# Altium integrated library SJ Sockets & Connectors.IntLib: 179 symbols (part 1 of 2) (continued)
## FHDR_1X17
designator P?
Female Header 1X17
footprint FHDR1X17-254P (Female Header 1X17 with 2.54 mm Pitch)
pins: 1, 2, 3, 4, 5, 6, 7, 8, 9, 10, 11, 12, 13, 14, 15, 16, 17
1 alternate drawing of the same symbol

## FHDR_1X18
designator P?
Female Header 1X18
footprint FHDR1X18-254P (Female Header 1X18 with 2.54 mm Pitch)
pins: 1, 2, 3, 4, 5, 6, 7, 8, 9, 10, 11, 12, 13, 14, 15, 16, 17, 18
1 alternate drawing of the same symbol

## FHDR_1X19
designator P?
Female Header 1X19
footprint FHDR1X19-254P (Female Header 1X19 with 2.54 mm Pitch)
pins: 1, 2, 3, 4, 5, 6, 7, 8, 9, 10, 11, 12, 13, 14, 15, 16, 17, 18, 19
1 alternate drawing of the same symbol

## FHDR_1X20
designator P?
Female Header 1X20
footprint FHDR1X20-254P (Female Header 1X20 with 2.54 mm Pitch)
pins: 1, 2, 3, 4, 5, 6, 7, 8, 9, 10, 11, 12, 13, 14, 15, 16, 17, 18, 19, 20
1 alternate drawing of the same symbol

## FHDR_1X22
designator P?
Female Header 1X22
footprint FHDR1X22-254P (Female Header 1X22 with 2.54 mm Pitch)
pins: 1, 2, 3, 4, 5, 6, 7, 8, 9, 10, 11, 12, 13, 14, 15, 16, 17, 18, 19, 20, 21, 22
1 alternate drawing of the same symbol

## FHDR_1X24
designator P?
Female Header 1X24
footprint FHDR1X24-254P (Female Header 1X24 with 2.54 mm Pitch)
pins: 1, 2, 3, 4, 5, 6, 7, 8, 9, 10, 11, 12, 13, 14, 15, 16, 17, 18, 19, 20, 21, 22, 23, 24
1 alternate drawing of the same symbol

## FHDR_1X25
designator P?
Female Header 1X25
footprint FHDR1X25-254P (Female Header 1X25 with 2.54 mm Pitch)
pins: 1, 2, 3, 4, 5, 6, 7, 8, 9, 10, 11, 12, 13, 14, 15, 16, 17, 18, 19, 20, 21, 22, 23, 24, 25
1 alternate drawing of the same symbol

## FHDR_1X26
designator P?
Female Header 1X26
footprint FHDR1X26-254P (Female Header 1X26 with 2.54 mm Pitch)
pins: 1, 2, 3, 4, 5, 6, 7, 8, 9, 10, 11, 12, 13, 14, 15, 16, 17, 18, 19, 20, 21, 22, 23, 24, 25, 26
1 alternate drawing of the same symbol

## FHDR_1X28
designator P?
Female Header 1X28
footprint FHDR1X28-254P (Female Header 1X28 with 2.54 mm Pitch)
pins: 1, 2, 3, 4, 5, 6, 7, 8, 9, 10, 11, 12, 13, 14, 15, 16, 17, 18, 19, 20, 21, 22, 23, 24, 25, 26, 27, 28
1 alternate drawing of the same symbol

## FHDR_1X30
designator P?
Female Header 1X30
footprint FHDR1X30-254P (Female Header 1X30 with 2.54 mm Pitch)
pins: 1, 2, 3, 4, 5, 6, 7, 8, 9, 10, 11, 12, 13, 14, 15, 16, 17, 18, 19, 20, 21, 22, 23, 24, 25, 26, 27, 28, 29, 30
1 alternate drawing of the same symbol

## FHDR_1X32
designator P?
Female Header 1X32
footprint FHDR1X32-254P (Female Header 1X32 with 2.54 mm Pitch)
pins: 1, 2, 3, 4, 5, 6, 7, 8, 9, 10, 11, 12, 13, 14, 15, 16, 17, 18, 19, 20, 21, 22, 23, 24, 25, 26, 27, 28, 29, 30, 31, 32
1 alternate drawing of the same symbol

## FHDR_1X34
designator P?
Female Header 1X34
footprint FHDR1X34-254P (Female Header 1X34 with 2.54 mm Pitch)
pins: 1, 2, 3, 4, 5, 6, 7, 8, 9, 10, 11, 12, 13, 14, 15, 16, 17, 18, 19, 20, 21, 22, 23, 24, 25, 26, 27, 28, 29, 30, 31, 32, 33, 34
1 alternate drawing of the same symbol

## FHDR_1X35
designator P?
Female Header 1X35
footprint FHDR1X35-254P (Female Header 1X35 with 2.54 mm Pitch)
pins: 1, 2, 3, 4, 5, 6, 7, 8, 9, 10, 11, 12, 13, 14, 15, 16, 17, 18, 19, 20, 21, 22, 23, 24, 25, 26, 27, 28, 29, 30, 31, 32, 33, 34, 35
1 alternate drawing of the same symbol

## FHDR_1X36
designator P?
Female Header 1X36
footprint FHDR1X36-254P (Female Header 1X36 with 2.54 mm Pitch)
pins: 1, 2, 3, 4, 5, 6, 7, 8, 9, 10, 11, 12, 13, 14, 15, 16, 17, 18, 19, 20, 21, 22, 23, 24, 25, 26, 27, 28, 29, 30, 31, 32, 33, 34, 35, 36
1 alternate drawing of the same symbol

## FHDR_1X38
designator P?
Female Header 1X38
footprint FHDR1X38-254P (Female Header 1X38 with 2.54 mm Pitch)
pins: 1, 2, 3, 4, 5, 6, 7, 8, 9, 10, 11, 12, 13, 14, 15, 16, 17, 18, 19, 20, 21, 22, 23, 24, 25, 26, 27, 28, 29, 30, 31, 32, 33, 34, 35, 36, 37, 38
1 alternate drawing of the same symbol

## FHDR_1X40
designator P?
Female Header 1X40
footprint FHDR1X40-254P (Female Header 1X40 with 2.54 mm Pitch)
pins: 1, 2, 3, 4, 5, 6, 7, 8, 9, 10, 11, 12, 13, 14, 15, 16, 17, 18, 19, 20, 21, 22, 23, 24, 25, 26, 27, 28, 29, 30, 31, 32, 33, 34, 35, 36, 37, 38, 39, 40
1 alternate drawing of the same symbol

## FHDR_2X02
designator P?
Female Header 2X02
footprint FHDR2X02-254P (Female Header 2X02 with 2.54 mm Pitch)
pins: 1, 2, 3, 4
1 alternate drawing of the same symbol

## FHDR_2X03
designator P?
Female Header 2X03
footprint FHDR2X03-254P (Female Header 2X03 with 2.54 mm Pitch)
pins: 1, 2, 3, 4, 5, 6
1 alternate drawing of the same symbol

## FHDR_2X04
designator P?
Female Header 2X04
footprint FHDR2X04-254P (Female Header 2X04 with 2.54 mm Pitch)
pins: 1, 2, 3, 4, 5, 6, 7, 8
1 alternate drawing of the same symbol

## FHDR_2X05
designator P?
Female Header 2X05
footprint FHDR2X05-254P (Female Header 2X05 with 2.54 mm Pitch)
pins: 1, 2, 3, 4, 5, 6, 7, 8, 9, 10
1 alternate drawing of the same symbol

## FHDR_2X06
designator P?
Female Header 2X06
footprint FHDR2X06-254P (Female Header 2X06 with 2.54 mm Pitch)
pins: 1, 2, 3, 4, 5, 6, 7, 8, 9, 10, 11, 12
1 alternate drawing of the same symbol

## FHDR_2X07
designator P?
Female Header 2X07
footprint FHDR2X07-254P (Female Header 2X07 with 2.54 mm Pitch)
pins: 1, 2, 3, 4, 5, 6, 7, 8, 9, 10, 11, 12, 13, 14
1 alternate drawing of the same symbol

## FHDR_2X08
designator P?
Female Header 2X08
footprint FHDR2X08-254P (Female Header 2X08 with 2.54 mm Pitch)
pins: 1, 2, 3, 4, 5, 6, 7, 8, 9, 10, 11, 12, 13, 14, 15, 16
1 alternate drawing of the same symbol

## FHDR_2X09
designator P?
Female Header 2X09
footprint FHDR2X09-254P (Female Header 2X09 with 2.54 mm Pitch)
pins: 1, 2, 3, 4, 5, 6, 7, 8, 9, 10, 11, 12, 13, 14, 15, 16, 17, 18
1 alternate drawing of the same symbol

## FHDR_2X10
designator P?
Female Header 2X10
footprint FHDR2X10-254P (Female Header 2X10 with 2.54 mm Pitch)
pins: 1, 2, 3, 4, 5, 6, 7, 8, 9, 10, 11, 12, 13, 14, 15, 16, 17, 18, 19, 20
1 alternate drawing of the same symbol

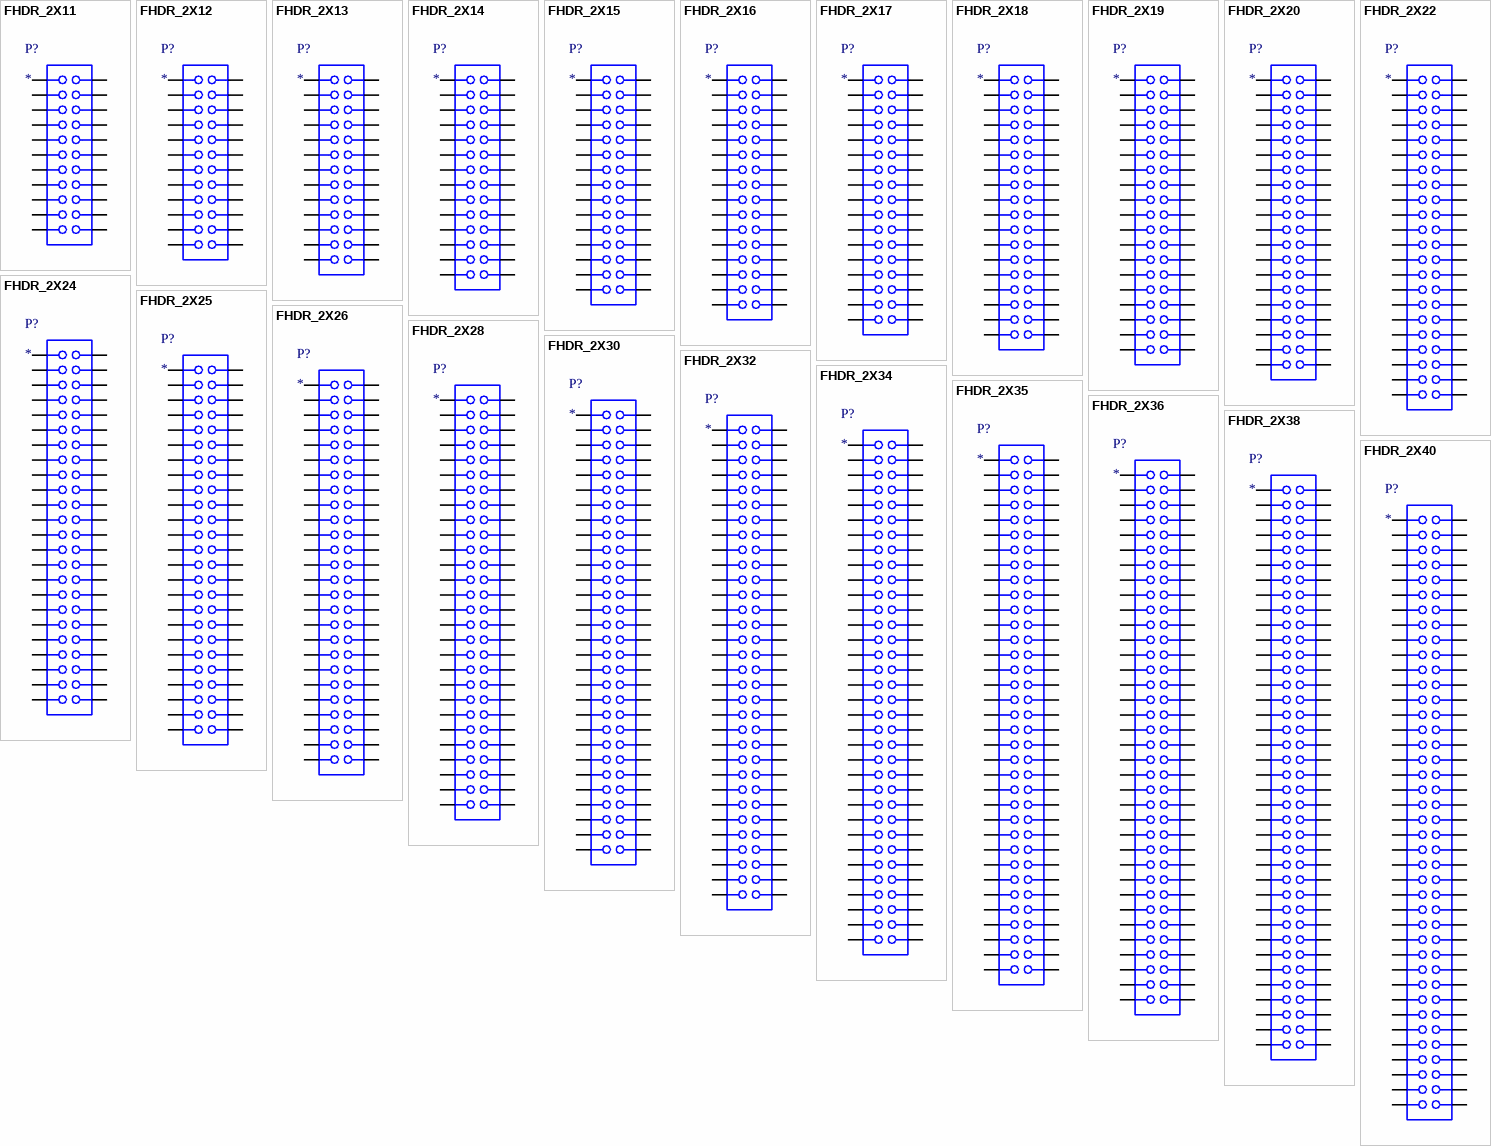
[diagram p3: symbols FHDR_2X11 to FHDR_2X40]

## FHDR_2X11
designator P?
Female Header 2X11
footprint FHDR2X11-254P (Female Header 2X11 with 2.54 mm Pitch)
pins: 1, 2, 3, 4, 5, 6, 7, 8, 9, 10, 11, 12, 13, 14, 15, 16, 17, 18, 19, 20, 21, 22
1 alternate drawing of the same symbol

## FHDR_2X12
designator P?
Female Header 2X12
footprint FHDR2X12-254P (Female Header 2X12 with 2.54 mm Pitch)
pins: 1, 2, 3, 4, 5, 6, 7, 8, 9, 10, 11, 12, 13, 14, 15, 16, 17, 18, 19, 20, 21, 22, 23, 24
1 alternate drawing of the same symbol

## FHDR_2X13
designator P?
Female Header 2X13
footprint FHDR2X13-254P (Female Header 2X13 with 2.54 mm Pitch)
pins: 1, 2, 3, 4, 5, 6, 7, 8, 9, 10, 11, 12, 13, 14, 15, 16, 17, 18, 19, 20, 21, 22, 23, 24, 25, 26
1 alternate drawing of the same symbol

## FHDR_2X14
designator P?
Female Header 2X14
footprint FHDR2X14-254P (Female Header 2X14 with 2.54 mm Pitch)
pins: 1, 2, 3, 4, 5, 6, 7, 8, 9, 10, 11, 12, 13, 14, 15, 16, 17, 18, 19, 20, 21, 22, 23, 24, 25, 26, 27, 28
1 alternate drawing of the same symbol

## FHDR_2X15
designator P?
Female Header 2X15
footprint FHDR2X15-254P (Female Header 2X15 with 2.54 mm Pitch)
pins: 1, 2, 3, 4, 5, 6, 7, 8, 9, 10, 11, 12, 13, 14, 15, 16, 17, 18, 19, 20, 21, 22, 23, 24, 25, 26, 27, 28, 29, 30
1 alternate drawing of the same symbol

## FHDR_2X16
designator P?
Female Header 2X16
footprint FHDR2X16-254P (Female Header 2X16 with 2.54 mm Pitch)
pins: 1, 2, 3, 4, 5, 6, 7, 8, 9, 10, 11, 12, 13, 14, 15, 16, 17, 18, 19, 20, 21, 22, 23, 24, 25, 26, 27, 28, 29, 30, 31, 32
1 alternate drawing of the same symbol

## FHDR_2X17
designator P?
Female Header 2X17
footprint FHDR2X17-254P (Female Header 2X17 with 2.54 mm Pitch)
pins: 1, 2, 3, 4, 5, 6, 7, 8, 9, 10, 11, 12, 13, 14, 15, 16, 17, 18, 19, 20, 21, 22, 23, 24, 25, 26, 27, 28, 29, 30, 31, 32, 33, 34
1 alternate drawing of the same symbol

## FHDR_2X18
designator P?
Female Header 2X18
footprint FHDR2X18-254P (Female Header 2X18 with 2.54 mm Pitch)
pins: 1, 2, 3, 4, 5, 6, 7, 8, 9, 10, 11, 12, 13, 14, 15, 16, 17, 18, 19, 20, 21, 22, 23, 24, 25, 26, 27, 28, 29, 30, 31, 32, 33, 34, 35, 36
1 alternate drawing of the same symbol

## FHDR_2X19
designator P?
Female Header 2X19
footprint FHDR2X19-254P (Female Header 2X19 with 2.54 mm Pitch)
pins: 1, 2, 3, 4, 5, 6, 7, 8, 9, 10, 11, 12, 13, 14, 15, 16, 17, 18, 19, 20, 21, 22, 23, 24, 25, 26, 27, 28, 29, 30, 31, 32, 33, 34, 35, 36, 37, 38
1 alternate drawing of the same symbol

## FHDR_2X20
designator P?
Female Header 2X20
footprint FHDR2X20-254P (Female Header 2X20 with 2.54 mm Pitch)
pins: 1, 2, 3, 4, 5, 6, 7, 8, 9, 10, 11, 12, 13, 14, 15, 16, 17, 18, 19, 20, 21, 22, 23, 24, 25, 26, 27, 28, 29, 30, 31, 32, 33, 34, 35, 36, 37, 38, 39, 40
1 alternate drawing of the same symbol

## FHDR_2X22
designator P?
Female Header 2X22
footprint FHDR2X22-254P (Female Header 2X22 with 2.54 mm Pitch)
pins: 1, 2, 3, 4, 5, 6, 7, 8, 9, 10, 11, 12, 13, 14, 15, 16, 17, 18, 19, 20, 21, 22, 23, 24, 25, 26, 27, 28, 29, 30, 31, 32, 33, 34, 35, 36, 37, 38, 39, 40, 41, 42, 43, 44
1 alternate drawing of the same symbol

## FHDR_2X24
designator P?
Female Header 2X24
footprint FHDR2X24-254P (Female Header 2X24 with 2.54 mm Pitch)
pins: 1, 2, 3, 4, 5, 6, 7, 8, 9, 10, 11, 12, 13, 14, 15, 16, 17, 18, 19, 20, 21, 22, 23, 24, 25, 26, 27, 28, 29, 30, 31, 32, 33, 34, 35, 36, 37, 38, 39, 40, 41, 42, 43, 44, 45, 46, 47, 48
1 alternate drawing of the same symbol

## FHDR_2X25
designator P?
Female Header 2X25
footprint FHDR2X25-254P (Female Header 2X25 with 2.54 mm Pitch)
pins: 1, 2, 3, 4, 5, 6, 7, 8, 9, 10, 11, 12, 13, 14, 15, 16, 17, 18, 19, 20, 21, 22, 23, 24, 25, 26, 27, 28, 29, 30, 31, 32, 33, 34, 35, 36, 37, 38, 39, 40, 41, 42, 43, 44, 45, 46, 47, 48, 49, 50
1 alternate drawing of the same symbol

## FHDR_2X26
designator P?
Female Header 2X26
footprint FHDR2X26-254P (Female Header 2X26 with 2.54 mm Pitch)
pins: 1, 2, 3, 4, 5, 6, 7, 8, 9, 10, 11, 12, 13, 14, 15, 16, 17, 18, 19, 20, 21, 22, 23, 24, 25, 26, 27, 28, 29, 30, 31, 32, 33, 34, 35, 36, 37, 38, 39, 40, 41, 42, 43, 44, 45, 46, 47, 48, 49, 50, 51, 52
1 alternate drawing of the same symbol

## FHDR_2X28
designator P?
Female Header 2X28
footprint FHDR2X28-254P (Female Header 2X28 with 2.54 mm Pitch)
pins: 1, 2, 3, 4, 5, 6, 7, 8, 9, 10, 11, 12, 13, 14, 15, 16, 17, 18, 19, 20, 21, 22, 23, 24, 25, 26, 27, 28, 29, 30, 31, 32, 33, 34, 35, 36, 37, 38, 39, 40, 41, 42, 43, 44, 45, 46, 47, 48, 49, 50, 51, 52, 53, 54, 55, 56
1 alternate drawing of the same symbol

## FHDR_2X30
designator P?
Female Header 2X30
footprint FHDR2X30-254P (Female Header 2X30 with 2.54 mm Pitch)
pins: 1, 2, 3, 4, 5, 6, 7, 8, 9, 10, 11, 12, 13, 14, 15, 16, 17, 18, 19, 20, 21, 22, 23, 24, 25, 26, 27, 28, 29, 30, 31, 32, 33, 34, 35, 36, 37, 38, 39, 40, 41, 42, 43, 44, 45, 46, 47, 48, 49, 50, 51, 52, 53, 54, 55, 56, 57, 58, 59, 60
1 alternate drawing of the same symbol

## FHDR_2X32
designator P?
Female Header 2X32
footprint FHDR2X32-254P (Female Header 2X32 with 2.54 mm Pitch)
pins: 1, 2, 3, 4, 5, 6, 7, 8, 9, 10, 11, 12, 13, 14, 15, 16, 17, 18, 19, 20, 21, 22, 23, 24, 25, 26, 27, 28, 29, 30, 31, 32, 33, 34, 35, 36, 37, 38, 39, 40, 41, 42, 43, 44, 45, 46, 47, 48, 49, 50, 51, 52, 53, 54, 55, 56, 57, 58, 59, 60, 61, 62, 63, 64
1 alternate drawing of the same symbol

## FHDR_2X34
designator P?
Female Header 2X34
footprint FHDR2X34-254P (Female Header 2X34 with 2.54 mm Pitch)
pins: 1, 2, 3, 4, 5, 6, 7, 8, 9, 10, 11, 12, 13, 14, 15, 16, 17, 18, 19, 20, 21, 22, 23, 24, 25, 26, 27, 28, 29, 30, 31, 32, 33, 34, 35, 36, 37, 38, 39, 40, 41, 42, 43, 44, 45, 46, 47, 48, 49, 50, 51, 52, 53, 54, 55, 56, 57, 58, 59, 60, 61, 62, 63, 64, 65, 66, 67, 68
1 alternate drawing of the same symbol

## FHDR_2X35
designator P?
Female Header 2X35
footprint FHDR2X35-254P (Female Header 2X35 with 2.54 mm Pitch)
pins: 1, 2, 3, 4, 5, 6, 7, 8, 9, 10, 11, 12, 13, 14, 15, 16, 17, 18, 19, 20, 21, 22, 23, 24, 25, 26, 27, 28, 29, 30, 31, 32, 33, 34, 35, 36, 37, 38, 39, 40, 41, 42, 43, 44, 45, 46, 47, 48, 49, 50, 51, 52, 53, 54, 55, 56, 57, 58, 59, 60, 61, 62, 63, 64, 65, 66, 67, 68, 69, 70
1 alternate drawing of the same symbol

## FHDR_2X36
designator P?
Female Header 2X36
footprint FHDR2X36-254P (Female Header 2X36 with 2.54 mm Pitch)
pins: 1, 2, 3, 4, 5, 6, 7, 8, 9, 10, 11, 12, 13, 14, 15, 16, 17, 18, 19, 20, 21, 22, 23, 24, 25, 26, 27, 28, 29, 30, 31, 32, 33, 34, 35, 36, 37, 38, 39, 40, 41, 42, 43, 44, 45, 46, 47, 48, 49, 50, 51, 52, 53, 54, 55, 56, 57, 58, 59, 60, 61, 62, 63, 64, 65, 66, 67, 68, 69, 70, 71, 72
1 alternate drawing of the same symbol

## FHDR_2X38
designator P?
Female Header 2X38
footprint FHDR2X38-254P (Female Header 2X38 with 2.54 mm Pitch)
pins: 1, 2, 3, 4, 5, 6, 7, 8, 9, 10, 11, 12, 13, 14, 15, 16, 17, 18, 19, 20, 21, 22, 23, 24, 25, 26, 27, 28, 29, 30, 31, 32, 33, 34, 35, 36, 37, 38, 39, 40, 41, 42, 43, 44, 45, 46, 47, 48, 49, 50, 51, 52, 53, 54, 55, 56, 57, 58, 59, 60, 61, 62, 63, 64, 65, 66, 67, 68, 69, 70, 71, 72, 73, 74, 75, 76
1 alternate drawing of the same symbol

## FHDR_2X40
designator P?
Female Header 2X40
footprint FHDR2X40-254P (Female Header 2X40 with 2.54 mm Pitch)
pins: 1, 2, 3, 4, 5, 6, 7, 8, 9, 10, 11, 12, 13, 14, 15, 16, 17, 18, 19, 20, 21, 22, 23, 24, 25, 26, 27, 28, 29, 30, 31, 32, 33, 34, 35, 36, 37, 38, 39, 40, 41, 42, 43, 44, 45, 46, 47, 48, 49, 50, 51, 52, 53, 54, 55, 56, 57, 58, 59, 60, 61, 62, 63, 64, 65, 66, 67, 68, 69, 70, 71, 72, 73, 74, 75, 76, 77, 78, 79, 80
1 alternate drawing of the same symbol


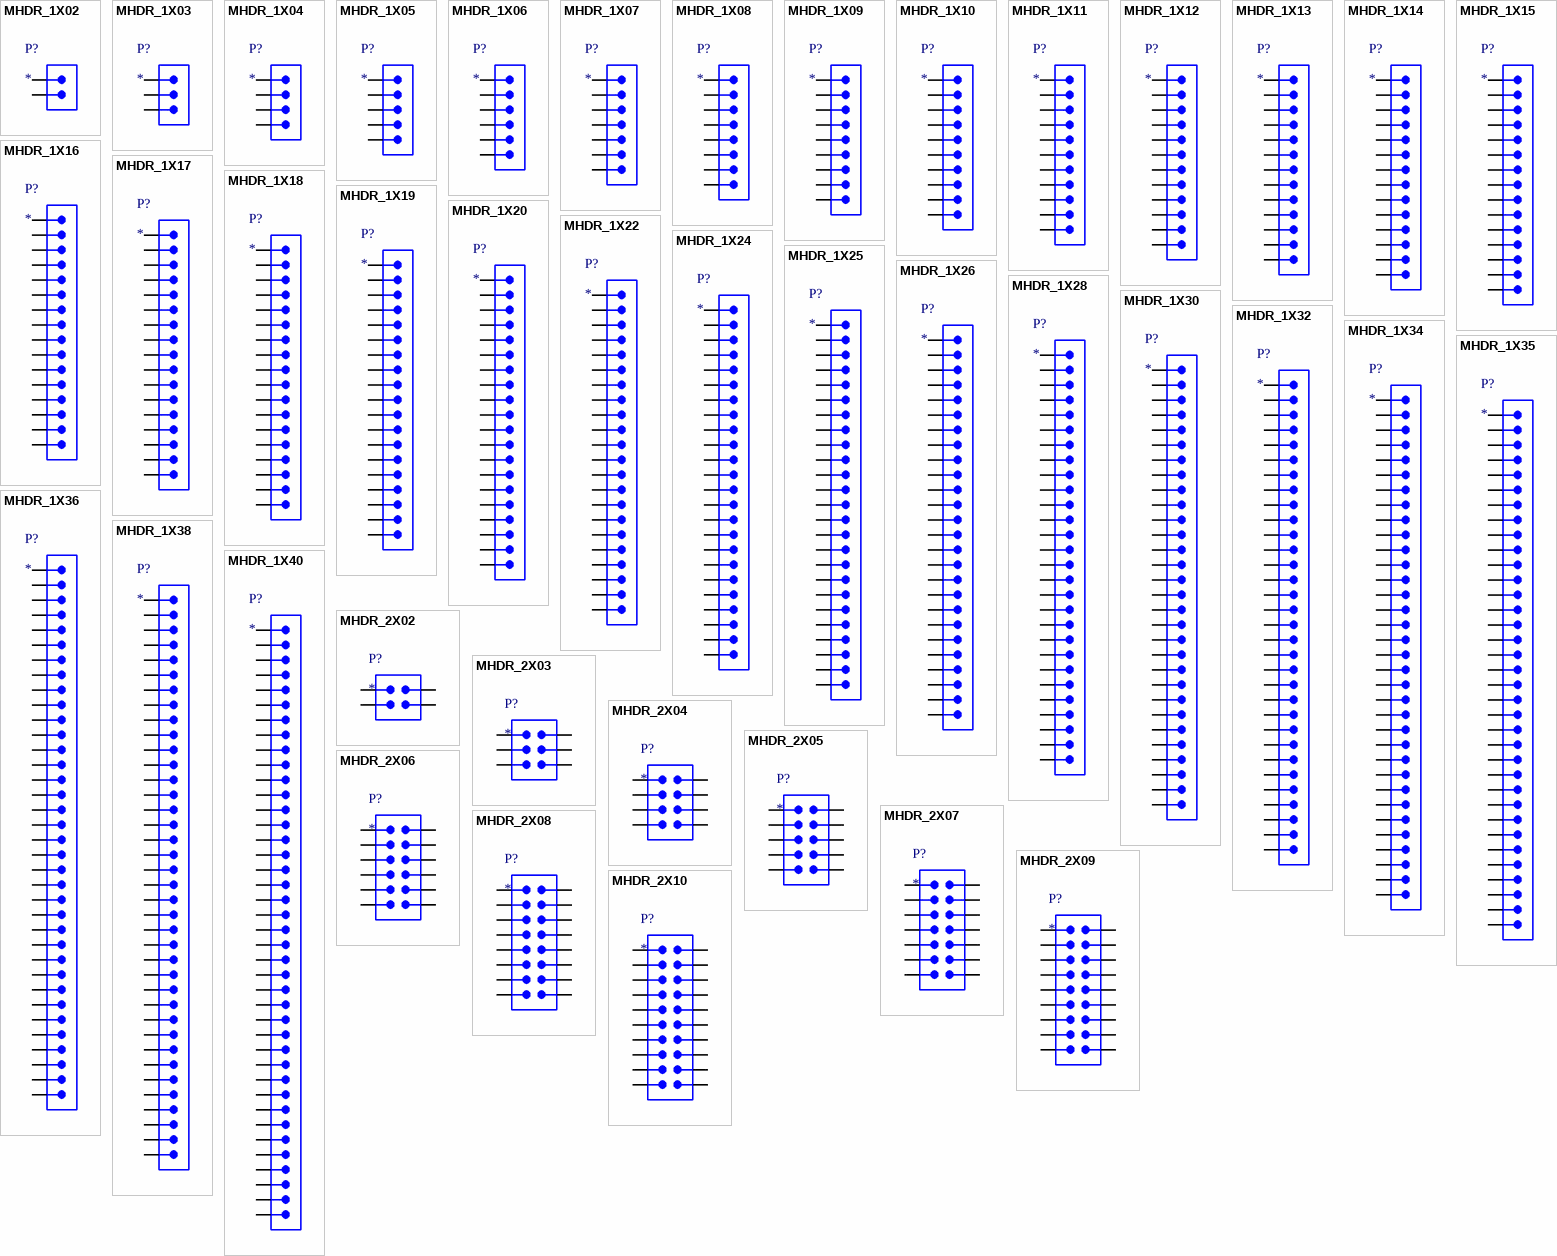
[diagram p4: symbols MHDR_1X02 to MHDR_2X10]

## MHDR_1X02
designator P?
Male Header 1X02
footprint MHDR1X02-254P (Male Header 1X02 with 2.54 mm Pitch)
pins: 1, 2
1 alternate drawing of the same symbol

## MHDR_1X03
designator P?
Male Header 1X03
footprint MHDR1X03-254P (Male Header 1X03 with 2.54 mm Pitch)
pins: 1, 2, 3
1 alternate drawing of the same symbol

## MHDR_1X04
designator P?
Male Header 1X04
footprint MHDR1X04-254P (Male Header 1X04 with 2.54 mm Pitch)
pins: 1, 2, 3, 4
1 alternate drawing of the same symbol

## MHDR_1X05
designator P?
Male Header 1X05
footprint MHDR1X05-254P (Male Header 1X05 with 2.54 mm Pitch)
pins: 1, 2, 3, 4, 5
1 alternate drawing of the same symbol

## MHDR_1X06
designator P?
Male Header 1X06
footprint MHDR1X06-254P (Male Header 1X06 with 2.54 mm Pitch)
pins: 1, 2, 3, 4, 5, 6
1 alternate drawing of the same symbol

## MHDR_1X07
designator P?
Male Header 1X07
footprint MHDR1X07-254P (Male Header 1X07 with 2.54 mm Pitch)
pins: 1, 2, 3, 4, 5, 6, 7
1 alternate drawing of the same symbol

## MHDR_1X08
designator P?
Male Header 1X08
footprint MHDR1X08-254P (Male Header 1X08 with 2.54 mm Pitch)
pins: 1, 2, 3, 4, 5, 6, 7, 8
1 alternate drawing of the same symbol

## MHDR_1X09
designator P?
Male Header 1X09
footprint MHDR1X09-254P (Male Header 1X09 with 2.54 mm Pitch)
pins: 1, 2, 3, 4, 5, 6, 7, 8, 9
1 alternate drawing of the same symbol

## MHDR_1X10
designator P?
Male Header 1X10
footprint MHDR1X10-254P - E (Male Header 1X10 with 2.54 mm Pitch)
footprint MHDR1X10-254P (Male Header 1X10 with 2.54 mm Pitch)
pins: 1, 2, 3, 4, 5, 6, 7, 8, 9, 10
1 alternate drawing of the same symbol

## MHDR_1X11
designator P?
Male Header 1X11
footprint MHDR1X11-254P (Male Header 1X11 with 2.54 mm Pitch)
pins: 1, 2, 3, 4, 5, 6, 7, 8, 9, 10, 11
1 alternate drawing of the same symbol

## MHDR_1X12
designator P?
Male Header 1X12
footprint MHDR1X12-254P (Male Header 1X12 with 2.54 mm Pitch)
pins: 1, 2, 3, 4, 5, 6, 7, 8, 9, 10, 11, 12
1 alternate drawing of the same symbol

## MHDR_1X13
designator P?
Male Header 1X13
footprint MHDR1X13-254P (Male Header 1X13 with 2.54 mm Pitch)
pins: 1, 2, 3, 4, 5, 6, 7, 8, 9, 10, 11, 12, 13
1 alternate drawing of the same symbol

## MHDR_1X14
designator P?
Male Header 1X14
footprint MHDR1X14-254P (Male Header 1X14 with 2.54 mm Pitch)
pins: 1, 2, 3, 4, 5, 6, 7, 8, 9, 10, 11, 12, 13, 14
1 alternate drawing of the same symbol

## MHDR_1X15
designator P?
Male Header 1X15
footprint MHDR1X15-254P (Male Header 1X15 with 2.54 mm Pitch)
pins: 1, 2, 3, 4, 5, 6, 7, 8, 9, 10, 11, 12, 13, 14, 15
1 alternate drawing of the same symbol

## MHDR_1X16
designator P?
Male Header 1X16
footprint MHDR1X16-254P (Male Header 1X16 with 2.54 mm Pitch)
pins: 1, 2, 3, 4, 5, 6, 7, 8, 9, 10, 11, 12, 13, 14, 15, 16
1 alternate drawing of the same symbol

## MHDR_1X17
designator P?
Male Header 1X17
footprint MHDR1X17-254P (Male Header 1X17 with 2.54 mm Pitch)
pins: 1, 2, 3, 4, 5, 6, 7, 8, 9, 10, 11, 12, 13, 14, 15, 16, 17
1 alternate drawing of the same symbol

## MHDR_1X18
designator P?
Male Header 1X18
footprint MHDR1X18-254P (Male Header 1X18 with 2.54 mm Pitch)
pins: 1, 2, 3, 4, 5, 6, 7, 8, 9, 10, 11, 12, 13, 14, 15, 16, 17, 18
1 alternate drawing of the same symbol

## MHDR_1X19
designator P?
Male Header 1X19
footprint MHDR1X19-254P (Male Header 1X19 with 2.54 mm Pitch)
pins: 1, 2, 3, 4, 5, 6, 7, 8, 9, 10, 11, 12, 13, 14, 15, 16, 17, 18, 19
1 alternate drawing of the same symbol

## MHDR_1X20
designator P?
Male Header 1X20
footprint MHDR1X20-254P (Male Header 1X20 with 2.54 mm Pitch)
pins: 1, 2, 3, 4, 5, 6, 7, 8, 9, 10, 11, 12, 13, 14, 15, 16, 17, 18, 19, 20
1 alternate drawing of the same symbol

## MHDR_1X22
designator P?
Male Header 1X22
footprint MHDR1X22-254P (Male Header 1X22 with 2.54 mm Pitch)
pins: 1, 2, 3, 4, 5, 6, 7, 8, 9, 10, 11, 12, 13, 14, 15, 16, 17, 18, 19, 20, 21, 22
1 alternate drawing of the same symbol

## MHDR_1X24
designator P?
Male Header 1X24
footprint MHDR1X24-254P (Male Header 1X24 with 2.54 mm Pitch)
pins: 1, 2, 3, 4, 5, 6, 7, 8, 9, 10, 11, 12, 13, 14, 15, 16, 17, 18, 19, 20, 21, 22, 23, 24
1 alternate drawing of the same symbol

## MHDR_1X25
designator P?
Male Header 1X25
footprint MHDR1X25-254P (Male Header 1X25 with 2.54 mm Pitch)
pins: 1, 2, 3, 4, 5, 6, 7, 8, 9, 10, 11, 12, 13, 14, 15, 16, 17, 18, 19, 20, 21, 22, 23, 24, 25
1 alternate drawing of the same symbol

## MHDR_1X26
designator P?
Male Header 1X26
footprint MHDR1X26-254P (Male Header 1X26 with 2.54 mm Pitch)
pins: 1, 2, 3, 4, 5, 6, 7, 8, 9, 10, 11, 12, 13, 14, 15, 16, 17, 18, 19, 20, 21, 22, 23, 24, 25, 26
1 alternate drawing of the same symbol

## MHDR_1X28
designator P?
Male Header 1X28
footprint MHDR1X28-254P (Male Header 1X28 with 2.54 mm Pitch)
pins: 1, 2, 3, 4, 5, 6, 7, 8, 9, 10, 11, 12, 13, 14, 15, 16, 17, 18, 19, 20, 21, 22, 23, 24, 25, 26, 27, 28
1 alternate drawing of the same symbol

## MHDR_1X30
designator P?
Male Header 1X30
footprint MHDR1X30-254P (Male Header 1X30 with 2.54 mm Pitch)
pins: 1, 2, 3, 4, 5, 6, 7, 8, 9, 10, 11, 12, 13, 14, 15, 16, 17, 18, 19, 20, 21, 22, 23, 24, 25, 26, 27, 28, 29, 30
1 alternate drawing of the same symbol

## MHDR_1X32
designator P?
Male Header 1X32
footprint MHDR1X32-254P (Male Header 1X32 with 2.54 mm Pitch)
pins: 1, 2, 3, 4, 5, 6, 7, 8, 9, 10, 11, 12, 13, 14, 15, 16, 17, 18, 19, 20, 21, 22, 23, 24, 25, 26, 27, 28, 29, 30, 31, 32
1 alternate drawing of the same symbol

## MHDR_1X34
designator P?
Male Header 1X34
footprint MHDR1X34-254P (Male Header 1X34 with 2.54 mm Pitch)
pins: 1, 2, 3, 4, 5, 6, 7, 8, 9, 10, 11, 12, 13, 14, 15, 16, 17, 18, 19, 20, 21, 22, 23, 24, 25, 26, 27, 28, 29, 30, 31, 32, 33, 34
1 alternate drawing of the same symbol

## MHDR_1X35
designator P?
Male Header 1X35
footprint MHDR1X35-254P (Male Header 1X35 with 2.54 mm Pitch)
pins: 1, 2, 3, 4, 5, 6, 7, 8, 9, 10, 11, 12, 13, 14, 15, 16, 17, 18, 19, 20, 21, 22, 23, 24, 25, 26, 27, 28, 29, 30, 31, 32, 33, 34, 35
1 alternate drawing of the same symbol

## MHDR_1X36
designator P?
Male Header 1X36
footprint MHDR1X36-254P (Male Header 1X36 with 2.54 mm Pitch)
pins: 1, 2, 3, 4, 5, 6, 7, 8, 9, 10, 11, 12, 13, 14, 15, 16, 17, 18, 19, 20, 21, 22, 23, 24, 25, 26, 27, 28, 29, 30, 31, 32, 33, 34, 35, 36
1 alternate drawing of the same symbol

## MHDR_1X38
designator P?
Male Header 1X38
footprint MHDR1X38-254P (Male Header 1X38 with 2.54 mm Pitch)
pins: 1, 2, 3, 4, 5, 6, 7, 8, 9, 10, 11, 12, 13, 14, 15, 16, 17, 18, 19, 20, 21, 22, 23, 24, 25, 26, 27, 28, 29, 30, 31, 32, 33, 34, 35, 36, 37, 38
1 alternate drawing of the same symbol

## MHDR_1X40
designator P?
Male Header 1X40
footprint MHDR1X40-254P (Male Header 1X40 with 2.54 mm Pitch)
pins: 1, 2, 3, 4, 5, 6, 7, 8, 9, 10, 11, 12, 13, 14, 15, 16, 17, 18, 19, 20, 21, 22, 23, 24, 25, 26, 27, 28, 29, 30, 31, 32, 33, 34, 35, 36, 37, 38, 39, 40
1 alternate drawing of the same symbol

## MHDR_2X02
designator P?
Male Header 2X02
footprint MHDR2X02-254P (Male Header 2X02 with 2.54 mm Pitch)
pins: 1, 2, 3, 4
1 alternate drawing of the same symbol

## MHDR_2X03
designator P?
Male Header 2X03
footprint MHDR2X03-254P - E (Male Header 2X03 with 2.54 mm Pitch)
footprint MHDR2X03-254P (Male Header 2X03 with 2.54 mm Pitch)
pins: 1, 2, 3, 4, 5, 6
1 alternate drawing of the same symbol

## MHDR_2X04
designator P?
Male Header 2X04
footprint MHDR2X04-254P (Male Header 2X04 with 2.54 mm Pitch)
pins: 1, 2, 3, 4, 5, 6, 7, 8
1 alternate drawing of the same symbol

## MHDR_2X05
designator P?
Male Header 2X05
footprint MHDR2X05-254P (Male Header 2X05 with 2.54 mm Pitch)
footprint MHDR2X05-254P - E (Male Header 2X05 with 2.54 mm Pitch)
pins: 1, 2, 3, 4, 5, 6, 7, 8, 9, 10
1 alternate drawing of the same symbol

## MHDR_2X06
designator P?
Male Header 2X06
footprint MHDR2X06-254P (Male Header 2X06 with 2.54 mm Pitch)
pins: 1, 2, 3, 4, 5, 6, 7, 8, 9, 10, 11, 12
1 alternate drawing of the same symbol

## MHDR_2X07
designator P?
Male Header 2X07
footprint MHDR2X07-254P (Male Header 2X07 with 2.54 mm Pitch)
pins: 1, 2, 3, 4, 5, 6, 7, 8, 9, 10, 11, 12, 13, 14
1 alternate drawing of the same symbol

## MHDR_2X08
designator P?
Male Header 2X08
footprint MHDR2X08-254P (Male Header 2X08 with 2.54 mm Pitch)
pins: 1, 2, 3, 4, 5, 6, 7, 8, 9, 10, 11, 12, 13, 14, 15, 16
1 alternate drawing of the same symbol

## MHDR_2X09
designator P?
Male Header 2X09
footprint MHDR2X09-254P (Male Header 2X09 with 2.54 mm Pitch)
pins: 1, 2, 3, 4, 5, 6, 7, 8, 9, 10, 11, 12, 13, 14, 15, 16, 17, 18
1 alternate drawing of the same symbol

## MHDR_2X10
designator P?
Male Header 2X10
footprint MHDR2X10-254P (Male Header 2X10 with 2.54 mm Pitch)
pins: 1, 2, 3, 4, 5, 6, 7, 8, 9, 10, 11, 12, 13, 14, 15, 16, 17, 18, 19, 20
1 alternate drawing of the same symbol

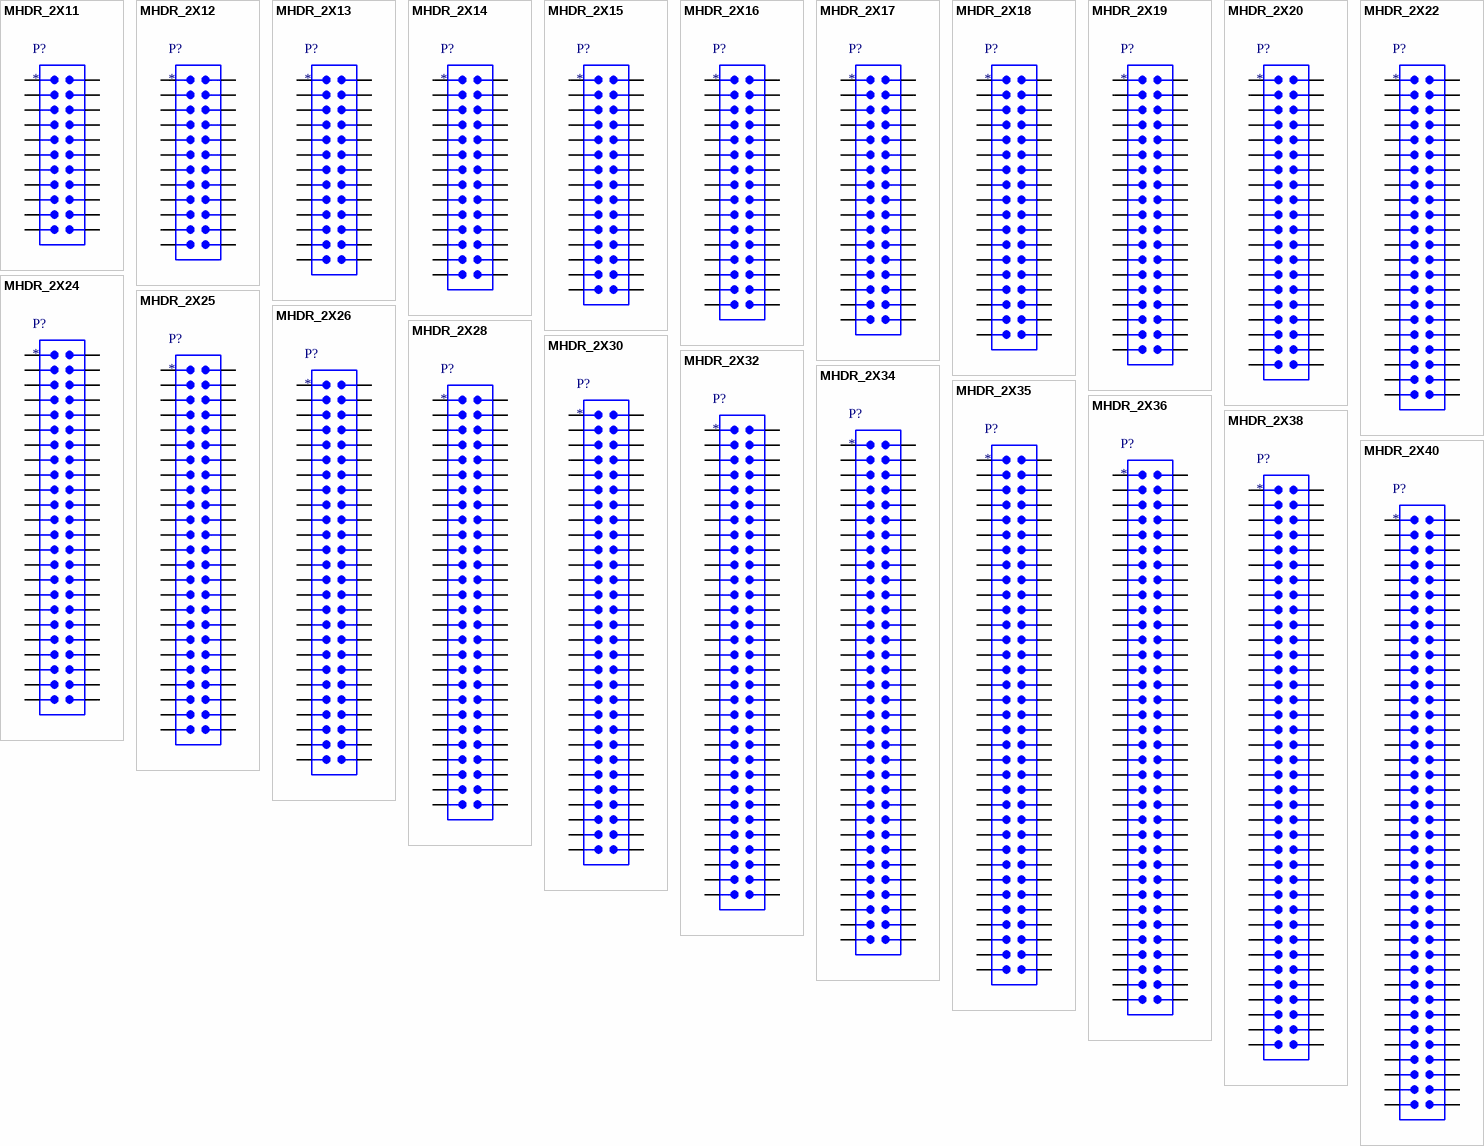
[diagram p5: symbols MHDR_2X11 to MHDR_2X40]

## MHDR_2X11
designator P?
Male Header 2X11
footprint MHDR2X11-254P (Male Header 2X11 with 2.54 mm Pitch)
pins: 1, 2, 3, 4, 5, 6, 7, 8, 9, 10, 11, 12, 13, 14, 15, 16, 17, 18, 19, 20, 21, 22
1 alternate drawing of the same symbol

## MHDR_2X12
designator P?
Male Header 2X12
footprint MHDR2X12-254P (Male Header 2X12 with 2.54 mm Pitch)
pins: 1, 2, 3, 4, 5, 6, 7, 8, 9, 10, 11, 12, 13, 14, 15, 16, 17, 18, 19, 20, 21, 22, 23, 24
1 alternate drawing of the same symbol

## MHDR_2X13
designator P?
Male Header 2X13
footprint MHDR2X13-254P (Male Header 2X13 with 2.54 mm Pitch)
pins: 1, 2, 3, 4, 5, 6, 7, 8, 9, 10, 11, 12, 13, 14, 15, 16, 17, 18, 19, 20, 21, 22, 23, 24, 25, 26
1 alternate drawing of the same symbol

## MHDR_2X14
designator P?
Male Header 2X14
footprint MHDR2X14-254P (Male Header 2X14 with 2.54 mm Pitch)
pins: 1, 2, 3, 4, 5, 6, 7, 8, 9, 10, 11, 12, 13, 14, 15, 16, 17, 18, 19, 20, 21, 22, 23, 24, 25, 26, 27, 28
1 alternate drawing of the same symbol

## MHDR_2X15
designator P?
Male Header 2X15
footprint MHDR2X15-254P (Male Header 2X15 with 2.54 mm Pitch)
pins: 1, 2, 3, 4, 5, 6, 7, 8, 9, 10, 11, 12, 13, 14, 15, 16, 17, 18, 19, 20, 21, 22, 23, 24, 25, 26, 27, 28, 29, 30
1 alternate drawing of the same symbol

## MHDR_2X16
designator P?
Male Header 2X16
footprint MHDR2X16-254P - E (Male Header 2X16 with 2.54 mm Pitch)
footprint MHDR2X16-254P (Male Header 2X16 with 2.54 mm Pitch)
pins: 1, 2, 3, 4, 5, 6, 7, 8, 9, 10, 11, 12, 13, 14, 15, 16, 17, 18, 19, 20, 21, 22, 23, 24, 25, 26, 27, 28, 29, 30, 31, 32
1 alternate drawing of the same symbol

## MHDR_2X17
designator P?
Male Header 2X17
footprint MHDR2X17-254P (Male Header 2X17 with 2.54 mm Pitch)
pins: 1, 2, 3, 4, 5, 6, 7, 8, 9, 10, 11, 12, 13, 14, 15, 16, 17, 18, 19, 20, 21, 22, 23, 24, 25, 26, 27, 28, 29, 30, 31, 32, 33, 34
1 alternate drawing of the same symbol

## MHDR_2X18
designator P?
Male Header 2X18
footprint MHDR2X18-254P (Male Header 2X18 with 2.54 mm Pitch)
pins: 1, 2, 3, 4, 5, 6, 7, 8, 9, 10, 11, 12, 13, 14, 15, 16, 17, 18, 19, 20, 21, 22, 23, 24, 25, 26, 27, 28, 29, 30, 31, 32, 33, 34, 35, 36
1 alternate drawing of the same symbol

## MHDR_2X19
designator P?
Male Header 2X19
footprint MHDR2X19-254P (Male Header 2X19 with 2.54 mm Pitch)
pins: 1, 2, 3, 4, 5, 6, 7, 8, 9, 10, 11, 12, 13, 14, 15, 16, 17, 18, 19, 20, 21, 22, 23, 24, 25, 26, 27, 28, 29, 30, 31, 32, 33, 34, 35, 36, 37, 38
1 alternate drawing of the same symbol

## MHDR_2X20
designator P?
Male Header 2X20
footprint MHDR2X20-254P (Male Header 2X20 with 2.54 mm Pitch)
pins: 1, 2, 3, 4, 5, 6, 7, 8, 9, 10, 11, 12, 13, 14, 15, 16, 17, 18, 19, 20, 21, 22, 23, 24, 25, 26, 27, 28, 29, 30, 31, 32, 33, 34, 35, 36, 37, 38, 39, 40
1 alternate drawing of the same symbol